# Altium footprint library WE-SHC.PcbLib: 139 footprints (part 4 of 10)
Each footprint in its own frame and in the unit in brackets; x right, y up, seen from the top. Pads: shape width x height; smd on the part's side, far side on the other; paste and mask are expansions set on the pad; w line width, h text height; cw(c..) or ccw(c..) is an arc to the next point about the centre after c.
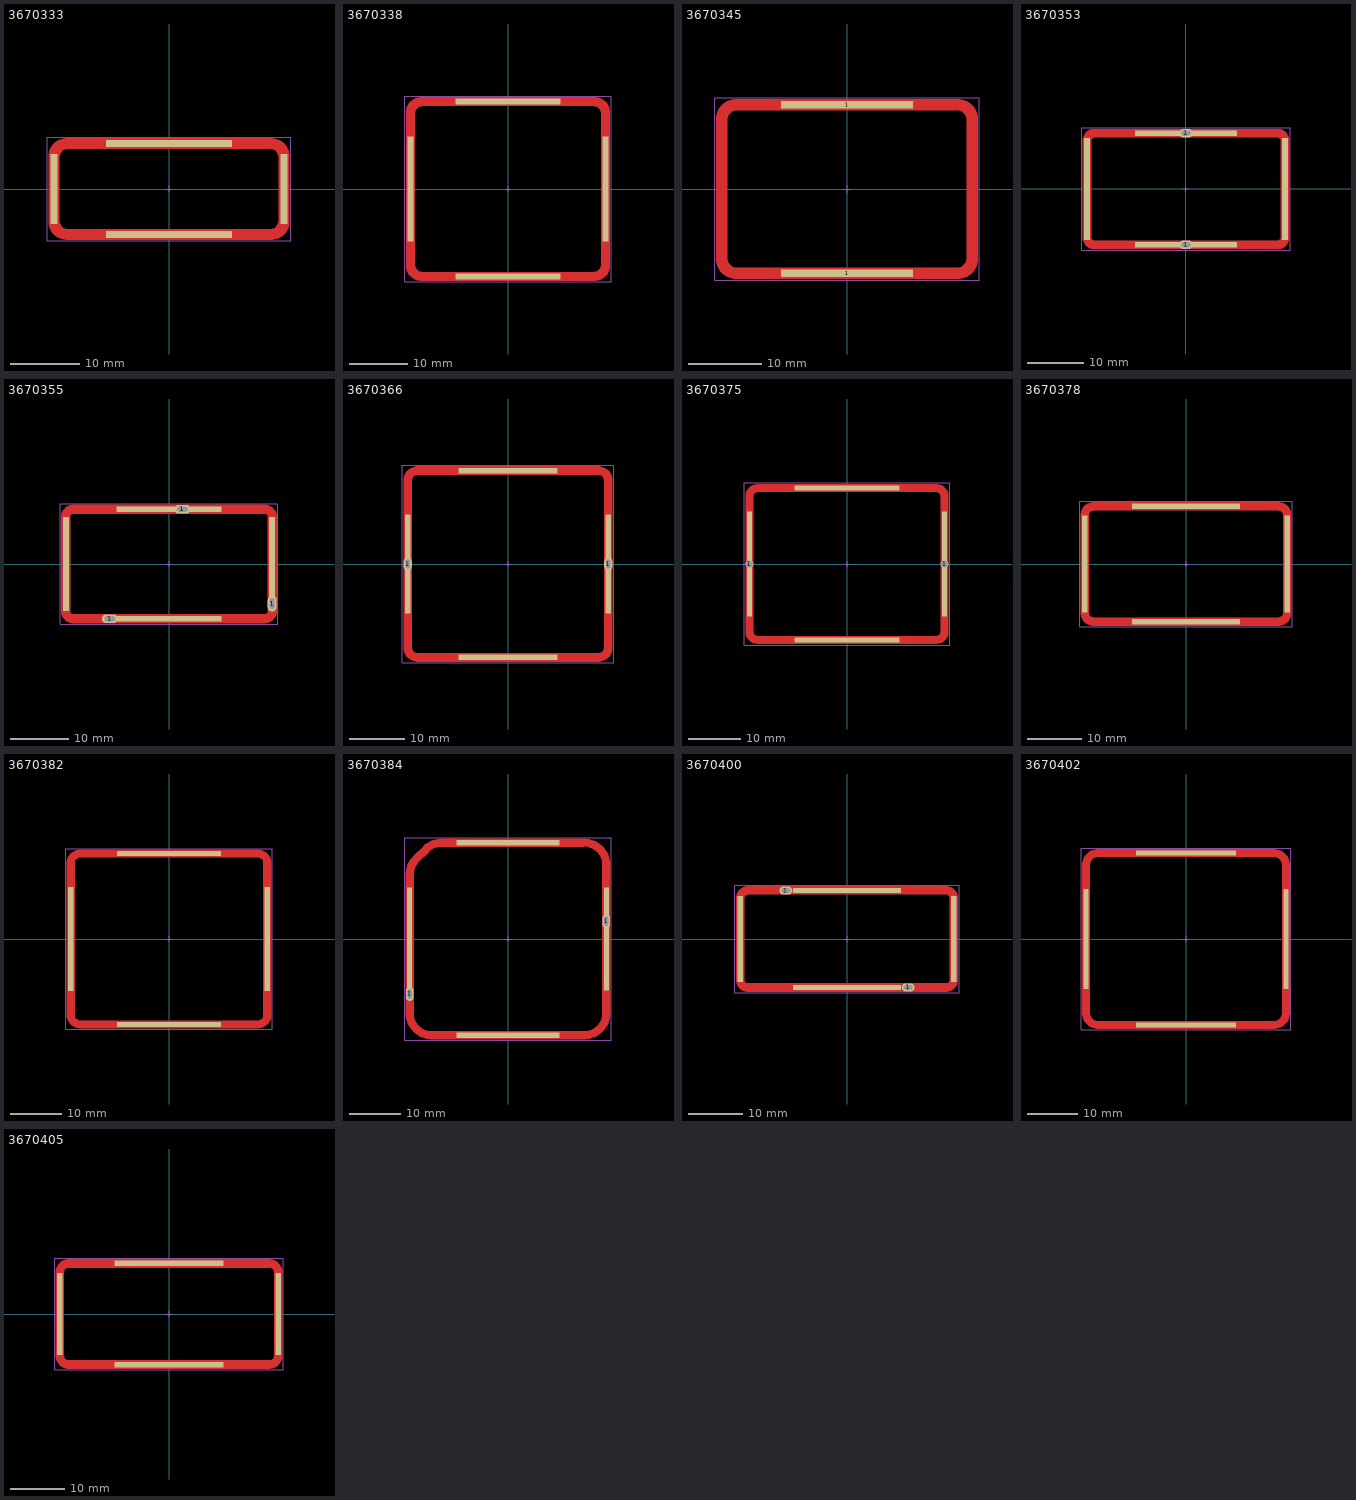
[diagram p3: the footprints below, top view; thin cyan lines are the x and y axes]

## 3670333 [mm] "Shielding Cabinet, SMT Frame Seamless, 33.3x13.3x4.4mm"
height 4.4
pads (4):
  rect 1x10 smd paste-2539.97 mask-2222: 1(-16.5,0) 1(16.5,0)
  rect 18x1 smd paste-2539.97 mask-2222: 1(0,-6.5) 1(0,6.5)
Top Layer:
  region: -17.25,-0.25 -17.25,-4.65 -17.25,-4.906 -17.15,-5.408 -16.954,-5.882 -16.67,-6.307 -16.307,-6.67 -15.882,-6.954 -15.408,-7.15 -14.906,-7.25 -14.65,-7.25 14.65,-7.25 14.906,-7.25 15.408,-7.15 15.882,-6.954 16.307,-6.67 16.67,-6.307 16.954,-5.882 17.15,-5.408 17.25,-4.906 17.25,-4.65 17.25,-0.25 15.75,-0.25 15.75,-4.45 15.744,-4.577 15.694,-4.827 15.596,-5.063 15.455,-5.275 15.275,-5.455 15.063,-5.596 14.827,-5.694 14.577,-5.744 14.45,-5.75 -14.45,-5.75 -14.577,-5.744 -14.827,-5.694 -15.063,-5.596 -15.275,-5.455 -15.455,-5.275 -15.596,-5.063 -15.694,-4.827 -15.744,-4.577 -15.75,-4.45 -15.75,-0.25
  region: -17.25,-1 -17.25,4.65 -17.25,4.906 -17.15,5.408 -16.954,5.882 -16.67,6.307 -16.307,6.67 -15.882,6.954 -15.408,7.15 -14.906,7.25 -14.65,7.25 14.65,7.25 14.906,7.25 15.408,7.15 15.882,6.954 16.307,6.67 16.67,6.307 16.954,5.882 17.15,5.408 17.25,4.906 17.25,4.65 17.25,-1 15.75,-1 15.75,4.45 15.744,4.577 15.694,4.827 15.596,5.063 15.455,5.275 15.275,5.455 15.063,5.596 14.827,5.694 14.577,5.744 14.45,5.75 -14.45,5.75 -14.577,5.744 -14.827,5.694 -15.063,5.596 -15.275,5.455 -15.455,5.275 -15.596,5.063 -15.694,4.827 -15.744,4.577 -15.75,4.45 -15.75,-1
Top Paste:
  region: -17.25,0.25 -17.25,4.65 -17.25,4.906 -17.15,5.408 -16.954,5.882 -16.67,6.307 -16.307,6.67 -15.882,6.954 -15.408,7.15 -14.906,7.25 -14.65,7.25 14.65,7.25 14.906,7.25 15.408,7.15 15.882,6.954 16.307,6.67 16.67,6.307 16.954,5.882 17.15,5.408 17.25,4.906 17.25,4.65 17.25,0.25 15.75,0.25 15.75,4.45 15.744,4.577 15.694,4.827 15.596,5.063 15.455,5.275 15.275,5.455 15.063,5.596 14.827,5.694 14.577,5.744 14.45,5.75 -14.45,5.75 -14.577,5.744 -14.827,5.694 -15.063,5.596 -15.275,5.455 -15.455,5.275 -15.596,5.063 -15.694,4.827 -15.744,4.577 -15.75,4.45 -15.75,0.25
  region: -17.25,-0.25 -17.25,-4.65 -17.25,-4.906 -17.15,-5.408 -16.954,-5.882 -16.67,-6.307 -16.307,-6.67 -15.882,-6.954 -15.408,-7.15 -14.906,-7.25 -14.65,-7.25 14.65,-7.25 14.906,-7.25 15.408,-7.15 15.882,-6.954 16.307,-6.67 16.67,-6.307 16.954,-5.882 17.15,-5.408 17.25,-4.906 17.25,-4.65 17.25,-0.25 15.75,-0.25 15.75,-4.45 15.744,-4.577 15.694,-4.827 15.596,-5.063 15.455,-5.275 15.275,-5.455 15.063,-5.596 14.827,-5.694 14.577,-5.744 14.45,-5.75 -14.45,-5.75 -14.577,-5.744 -14.827,-5.694 -15.063,-5.596 -15.275,-5.455 -15.455,-5.275 -15.596,-5.063 -15.694,-4.827 -15.744,-4.577 -15.75,-4.45 -15.75,-0.25
Notes:
  text "recommended tin paste thickness=0.5mm / customer to define the final stencil gap" at -6.1,-8.9 h0.4
Top Designator:
  text ".Designator" at -7.498,-0.5 h1.5
Top Component Outline:
  lines w0.1: -16.65,-4.65 ccw(c-14.65,-4.65) -14.65,-6.65 14.65,-6.65 ccw(c14.65,-4.65) 16.65,-4.65 16.65,4.65 ccw(c14.65,4.65) 14.65,6.65 -14.65,6.65 ccw(c-14.65,4.65) -16.65,4.65 -16.65,-4.65
Top 3D Body:
  lines w0.1: -16.65,-4.65 ccw(c-14.65,-4.65) -14.65,-6.65 14.65,-6.65 ccw(c14.65,-4.65) 16.65,-4.65 16.65,4.65 ccw(c14.65,4.65) 14.65,6.65 -14.65,6.65 ccw(c-14.65,4.65) -16.65,4.65 -16.65,-4.65
Top Courtyard:
  lines w0.05: -0.5,0 0.5,0 ; 0,-0.5 0,0.5 ; -17.45,-7.45 -17.45,7.45 17.45,7.45 17.45,-7.45 -17.45,-7.45
3D body "3670333.stp": height 4.4, standoff 0, extent -16.65,-6.65 16.65,6.65

## 3670338 [mm] "Shielding Cabinet, SMT Frame Seamless, 33.8x30.3x3.3mm"
height 3.3
pads (4):
  rect 1x18 smd paste-2539.97 mask-2222: 1(-16.75,0) 1(16.75,0)
  rect 18x1 smd paste-2539.97 mask-2222: 1(0,-15) 1(0,15)
Top Layer:
  region: -17.5,-1 -17.5,13.15 -17.5,13.406 -17.4,13.908 -17.204,14.382 -16.92,14.807 -16.557,15.17 -16.132,15.454 -15.658,15.65 -15.156,15.75 -14.9,15.75 14.9,15.75 15.156,15.75 15.658,15.65 16.132,15.454 16.557,15.17 16.92,14.807 17.204,14.382 17.4,13.908 17.5,13.406 17.5,13.15 17.5,-1 16,-1 16,12.95 15.994,13.077 15.944,13.327 15.846,13.563 15.705,13.775 15.525,13.955 15.313,14.096 15.077,14.194 14.827,14.244 14.7,14.25 -14.7,14.25 -14.827,14.244 -15.077,14.194 -15.313,14.096 -15.525,13.955 -15.705,13.775 -15.846,13.563 -15.944,13.327 -15.994,13.077 -16,12.95 -16,-1
  region: -17.5,-0.25 -17.5,-13.15 -17.5,-13.406 -17.4,-13.908 -17.204,-14.382 -16.92,-14.807 -16.557,-15.17 -16.132,-15.454 -15.658,-15.65 -15.156,-15.75 -14.9,-15.75 14.9,-15.75 15.156,-15.75 15.658,-15.65 16.132,-15.454 16.557,-15.17 16.92,-14.807 17.204,-14.382 17.4,-13.908 17.5,-13.406 17.5,-13.15 17.5,-0.25 16,-0.25 16,-12.95 15.994,-13.077 15.944,-13.327 15.846,-13.563 15.705,-13.775 15.525,-13.955 15.313,-14.096 15.077,-14.194 14.827,-14.244 14.7,-14.25 -14.7,-14.25 -14.827,-14.244 -15.077,-14.194 -15.313,-14.096 -15.525,-13.955 -15.705,-13.775 -15.846,-13.563 -15.944,-13.327 -15.994,-13.077 -16,-12.95 -16,-0.25
Top Paste:
  region: -17.5,-0.25 -17.5,-13.15 -17.5,-13.406 -17.4,-13.908 -17.204,-14.382 -16.92,-14.807 -16.557,-15.17 -16.132,-15.454 -15.658,-15.65 -15.156,-15.75 -14.9,-15.75 14.9,-15.75 15.156,-15.75 15.658,-15.65 16.132,-15.454 16.557,-15.17 16.92,-14.807 17.204,-14.382 17.4,-13.908 17.5,-13.406 17.5,-13.15 17.5,-0.25 16,-0.25 16,-12.95 15.994,-13.077 15.944,-13.327 15.846,-13.563 15.705,-13.775 15.525,-13.955 15.313,-14.096 15.077,-14.194 14.827,-14.244 14.7,-14.25 -14.7,-14.25 -14.827,-14.244 -15.077,-14.194 -15.313,-14.096 -15.525,-13.955 -15.705,-13.775 -15.846,-13.563 -15.944,-13.327 -15.994,-13.077 -16,-12.95 -16,-0.25
  region: -17.5,0.25 -17.5,13.15 -17.5,13.406 -17.4,13.908 -17.204,14.382 -16.92,14.807 -16.557,15.17 -16.132,15.454 -15.658,15.65 -15.156,15.75 -14.9,15.75 14.9,15.75 15.156,15.75 15.658,15.65 16.132,15.454 16.557,15.17 16.92,14.807 17.204,14.382 17.4,13.908 17.5,13.406 17.5,13.15 17.5,0.25 16,0.25 16,12.95 15.994,13.077 15.944,13.327 15.846,13.563 15.705,13.775 15.525,13.955 15.313,14.096 15.077,14.194 14.827,14.244 14.7,14.25 -14.7,14.25 -14.827,14.244 -15.077,14.194 -15.313,14.096 -15.525,13.955 -15.705,13.775 -15.846,13.563 -15.944,13.327 -15.994,13.077 -16,12.95 -16,0.25
Notes:
  text "recommended tin paste thickness=0.5mm / customer to define the final stencil gap" at -5.55,-17.45 h0.4
Top Designator:
  text ".Designator" at -7.498,-0.5 h1.5
Top Component Outline:
  lines w0.1: -16.9,-13.15 ccw(c-14.9,-13.15) -14.9,-15.15 14.9,-15.15 ccw(c14.9,-13.15) 16.9,-13.15 16.9,13.15 ccw(c14.9,13.15) 14.9,15.15 -14.9,15.15 ccw(c-14.9,13.15) -16.9,13.15 -16.9,-13.15
Top 3D Body:
  lines w0.1: -16.9,-13.15 ccw(c-14.9,-13.15) -14.9,-15.15 14.9,-15.15 ccw(c14.9,-13.15) 16.9,-13.15 16.9,13.15 ccw(c14.9,13.15) 14.9,15.15 -14.9,15.15 ccw(c-14.9,13.15) -16.9,13.15 -16.9,-13.15
Top Courtyard:
  lines w0.05: -0.5,0 0.5,0 ; 0,-0.5 0,0.5 ; -17.7,-15.95 -17.7,15.95 17.7,15.95 17.7,-15.95 -17.7,-15.95
3D body "3670338.stp": height 3.3, standoff 0, extent -16.9,-15.15 16.9,15.15

## 3670345 [mm] "Shielding Cabinet, SMT Frame Seamless, 34.5x23.3x3.5mm"
height 3.5
pads (2):
  rect 18x1 smd paste-2539.97 mask-2222: 1(0,-11.5) 1(0,11.5)
Top Layer:
  region: -17.85,-1 -17.85,9.65 -17.85,9.906 -17.75,10.408 -17.554,10.882 -17.27,11.307 -16.907,11.67 -16.482,11.954 -16.008,12.15 -15.506,12.25 -15.25,12.25 15.25,12.25 15.506,12.25 16.008,12.15 16.482,11.954 16.907,11.67 17.27,11.307 17.554,10.882 17.75,10.408 17.85,9.906 17.85,9.65 17.85,-1 16.35,-1 16.35,9.45 16.344,9.577 16.294,9.827 16.196,10.063 16.055,10.275 15.875,10.455 15.663,10.596 15.427,10.694 15.177,10.744 15.05,10.75 -15.05,10.75 -15.177,10.744 -15.427,10.694 -15.663,10.596 -15.875,10.455 -16.055,10.275 -16.196,10.063 -16.294,9.827 -16.344,9.577 -16.35,9.45 -16.35,-1
  region: -17.85,-0.25 -17.85,-9.65 -17.85,-9.906 -17.75,-10.408 -17.554,-10.882 -17.27,-11.307 -16.907,-11.67 -16.482,-11.954 -16.008,-12.15 -15.506,-12.25 -15.25,-12.25 15.25,-12.25 15.506,-12.25 16.008,-12.15 16.482,-11.954 16.907,-11.67 17.27,-11.307 17.554,-10.882 17.75,-10.408 17.85,-9.906 17.85,-9.65 17.85,-0.25 16.35,-0.25 16.35,-9.45 16.344,-9.577 16.294,-9.827 16.196,-10.063 16.055,-10.275 15.875,-10.455 15.663,-10.596 15.427,-10.694 15.177,-10.744 15.05,-10.75 -15.05,-10.75 -15.177,-10.744 -15.427,-10.694 -15.663,-10.596 -15.875,-10.455 -16.055,-10.275 -16.196,-10.063 -16.294,-9.827 -16.344,-9.577 -16.35,-9.45 -16.35,-0.25
Top Paste:
  region: -17.85,-0.25 -17.85,-9.65 -17.85,-9.906 -17.75,-10.408 -17.554,-10.882 -17.27,-11.307 -16.907,-11.67 -16.482,-11.954 -16.008,-12.15 -15.506,-12.25 -15.25,-12.25 15.25,-12.25 15.506,-12.25 16.008,-12.15 16.482,-11.954 16.907,-11.67 17.27,-11.307 17.554,-10.882 17.75,-10.408 17.85,-9.906 17.85,-9.65 17.85,-0.25 16.35,-0.25 16.35,-9.45 16.344,-9.577 16.294,-9.827 16.196,-10.063 16.055,-10.275 15.875,-10.455 15.663,-10.596 15.427,-10.694 15.177,-10.744 15.05,-10.75 -15.05,-10.75 -15.177,-10.744 -15.427,-10.694 -15.663,-10.596 -15.875,-10.455 -16.055,-10.275 -16.196,-10.063 -16.294,-9.827 -16.344,-9.577 -16.35,-9.45 -16.35,-0.25
  region: -17.85,0.25 -17.85,9.65 -17.85,9.906 -17.75,10.408 -17.554,10.882 -17.27,11.307 -16.907,11.67 -16.482,11.954 -16.008,12.15 -15.506,12.25 -15.25,12.25 15.25,12.25 15.506,12.25 16.008,12.15 16.482,11.954 16.907,11.67 17.27,11.307 17.554,10.882 17.75,10.408 17.85,9.906 17.85,9.65 17.85,0.25 16.35,0.25 16.35,9.45 16.344,9.577 16.294,9.827 16.196,10.063 16.055,10.275 15.875,10.455 15.663,10.596 15.427,10.694 15.177,10.744 15.05,10.75 -15.05,10.75 -15.177,10.744 -15.427,10.694 -15.663,10.596 -15.875,10.455 -16.055,10.275 -16.196,10.063 -16.294,9.827 -16.344,9.577 -16.35,9.45 -16.35,0.25
Notes:
  text "recommended tin paste thickness=0.5mm / customer to define the final stencil gap" at -5.5,-13.85 h0.4
Top Designator:
  text ".Designator" at -7.498,-0.5 h1.5
Top Component Outline:
  lines w0.1: -17.25,-9.65 ccw(c-15.25,-9.65) -15.25,-11.65 15.25,-11.65 ccw(c15.25,-9.65) 17.25,-9.65 17.25,9.65 ccw(c15.25,9.65) 15.25,11.65 -15.25,11.65 ccw(c-15.25,9.65) -17.25,9.65 -17.25,-9.65
Top 3D Body:
  lines w0.1: -17.25,-9.65 ccw(c-15.25,-9.65) -15.25,-11.65 15.25,-11.65 ccw(c15.25,-9.65) 17.25,-9.65 17.25,9.65 ccw(c15.25,9.65) 15.25,11.65 -15.25,11.65 ccw(c-15.25,9.65) -17.25,9.65 -17.25,-9.65
Top Courtyard:
  lines w0.05: -0.5,0 0.5,0 ; 0,-0.5 0,0.5 ; -18.05,-12.45 -18.05,12.45 18.05,12.45 18.05,-12.45 -18.05,-12.45
3D body "3670345.stp": height 3.5, standoff 0, extent -17.25,-11.65 17.25,11.65

## 3670353 [mm] "Shielding Cabinet, SMT Frame Seamless, 35.3x20x6.4mm"
height 6.4
pads (6):
  rect 1x18 smd paste-2539.97 mask-2222: 1(-17.5,0) 1(17.5,0)
  rect 18x1 smd paste-2539.97 mask-2222: 1(0,-9.85) 1(0,9.85)
  oval 2.4x1.5 hole 0.8 slot 1.6 at 0 deg: 1(0,-9.85) 1(0,9.85)
Top Layer:
  region: -18.25,-1 -18.25,8.55 -18.25,8.752 -18.171,9.148 -18.017,9.521 -17.792,9.857 -17.507,10.142 -17.171,10.367 -16.798,10.521 -16.402,10.6 -16.2,10.6 16.2,10.6 16.402,10.6 16.798,10.521 17.171,10.367 17.507,10.142 17.792,9.857 18.017,9.521 18.171,9.148 18.25,8.752 18.25,8.55 18.25,-1 16.75,-1 16.75,8.55 16.739,8.657 16.657,8.856 16.506,9.007 16.307,9.089 16.2,9.1 -16.2,9.1 -16.307,9.089 -16.506,9.007 -16.657,8.856 -16.739,8.657 -16.75,8.55 -16.75,-1
  region: -18.25,-0.25 -18.25,-8.55 -18.25,-8.752 -18.171,-9.148 -18.017,-9.521 -17.792,-9.857 -17.507,-10.142 -17.171,-10.367 -16.798,-10.521 -16.402,-10.6 -16.2,-10.6 16.2,-10.6 16.402,-10.6 16.798,-10.521 17.171,-10.367 17.507,-10.142 17.792,-9.857 18.017,-9.521 18.171,-9.148 18.25,-8.752 18.25,-8.55 18.25,-0.25 16.75,-0.25 16.75,-8.55 16.739,-8.657 16.657,-8.856 16.506,-9.007 16.307,-9.089 16.2,-9.1 -16.2,-9.1 -16.307,-9.089 -16.506,-9.007 -16.657,-8.856 -16.739,-8.657 -16.75,-8.55 -16.75,-0.25
Top Paste:
  region: -18.25,-0.25 -18.25,-8.55 -18.25,-8.752 -18.171,-9.148 -18.017,-9.521 -17.792,-9.857 -17.507,-10.142 -17.171,-10.367 -16.798,-10.521 -16.402,-10.6 -16.2,-10.6 16.2,-10.6 16.402,-10.6 16.798,-10.521 17.171,-10.367 17.507,-10.142 17.792,-9.857 18.017,-9.521 18.171,-9.148 18.25,-8.752 18.25,-8.55 18.25,-0.25 16.75,-0.25 16.75,-8.55 16.739,-8.657 16.657,-8.856 16.506,-9.007 16.307,-9.089 16.2,-9.1 -16.2,-9.1 -16.307,-9.089 -16.506,-9.007 -16.657,-8.856 -16.739,-8.657 -16.75,-8.55 -16.75,-0.25
  region: -18.25,0.25 -18.25,8.55 -18.25,8.752 -18.171,9.148 -18.017,9.521 -17.792,9.857 -17.507,10.142 -17.171,10.367 -16.798,10.521 -16.402,10.6 -16.2,10.6 16.2,10.6 16.402,10.6 16.798,10.521 17.171,10.367 17.507,10.142 17.792,9.857 18.017,9.521 18.171,9.148 18.25,8.752 18.25,8.55 18.25,0.25 16.75,0.25 16.75,8.55 16.739,8.657 16.657,8.856 16.506,9.007 16.307,9.089 16.2,9.1 -16.2,9.1 -16.307,9.089 -16.506,9.007 -16.657,8.856 -16.739,8.657 -16.75,8.55 -16.75,0.25
Notes:
  text "recommended tin paste thickness=0.5mm / customer to define the final stencil gap" at -5.4,-12.25 h0.4
Top Designator:
  text ".Designator" at -7.498,-0.5 h1.5
Top Component Outline:
  lines w0.1: -17.65,-8.5 ccw(c-16.15,-8.5) -16.15,-10 16.15,-10 ccw(c16.15,-8.5) 17.65,-8.5 17.65,8.5 ccw(c16.15,8.5) 16.15,10 -16.15,10 ccw(c-16.15,8.5) -17.65,8.5 -17.65,-8.5
Top 3D Body:
  lines w0.1: -17.65,-8.5 ccw(c-16.15,-8.5) -16.15,-10 16.15,-10 ccw(c16.15,-8.5) 17.65,-8.5 17.65,8.5 ccw(c16.15,8.5) 16.15,10 -16.15,10 ccw(c-16.15,8.5) -17.65,8.5 -17.65,-8.5
Top Courtyard:
  lines w0.05: -0.5,0 0.5,0 ; 0,-0.5 0,0.5 ; -18.45,-10.8 -18.45,10.8 18.45,10.8 18.45,-10.8 -18.45,-10.8
3D body "3670353.stp": height 6.4, standoff -0.6, extent -17.65,-10 17.65,10

## 3670355 [mm] "Shielding Cabinet, SMT Frame Seamless, 35.5x19x5.5mm"
height 5.5
pads (7):
  rect 1x16 smd paste-2539.97 mask-2222: 1(-17.6,0) 1(17.6,0)
  oval 2.7x1.5 hole 0.8 slot 1.8 at 0 deg: 1(-10.1,-9.35) 1(2.3,9.35)
  rect 18x1 smd paste-2539.97 mask-2222: 1(0,-9.35) 1(0,9.35)
  oval 1.5x2.7 hole 0.8 slot 1.8 at 90 deg: 1(17.6,-6.75)
Top Layer:
  region: -18.35,-0.25 -18.35,-8.1 -18.35,-8.297 -18.273,-8.683 -18.122,-9.047 -17.903,-9.375 -17.625,-9.654 -17.297,-9.872 -16.933,-10.023 -16.547,-10.1 -16.35,-10.1 16.35,-10.1 16.547,-10.1 16.933,-10.023 17.297,-9.872 17.625,-9.654 17.903,-9.375 18.122,-9.047 18.273,-8.683 18.35,-8.297 18.35,-8.1 18.35,-0.25 16.85,-0.25 16.85,-8.1 16.84,-8.198 16.766,-8.378 16.628,-8.516 16.448,-8.59 16.35,-8.6 -16.35,-8.6 -16.448,-8.59 -16.628,-8.516 -16.766,-8.378 -16.84,-8.198 -16.85,-8.1 -16.85,-0.25
  region: -18.35,-1 -18.35,8.1 -18.35,8.297 -18.273,8.683 -18.122,9.047 -17.903,9.375 -17.625,9.654 -17.297,9.872 -16.933,10.023 -16.547,10.1 -16.35,10.1 16.35,10.1 16.547,10.1 16.933,10.023 17.297,9.872 17.625,9.654 17.903,9.375 18.122,9.047 18.273,8.683 18.35,8.297 18.35,8.1 18.35,-1 16.85,-1 16.85,8.1 16.84,8.198 16.766,8.378 16.628,8.516 16.448,8.59 16.35,8.6 -16.35,8.6 -16.448,8.59 -16.628,8.516 -16.766,8.378 -16.84,8.198 -16.85,8.1 -16.85,-1
Top Paste:
  region: -18.35,0.25 -18.35,8.1 -18.35,8.297 -18.273,8.683 -18.122,9.047 -17.903,9.375 -17.625,9.654 -17.297,9.872 -16.933,10.023 -16.547,10.1 -16.35,10.1 16.35,10.1 16.547,10.1 16.933,10.023 17.297,9.872 17.625,9.654 17.903,9.375 18.122,9.047 18.273,8.683 18.35,8.297 18.35,8.1 18.35,0.25 16.85,0.25 16.85,8.1 16.84,8.198 16.766,8.378 16.628,8.516 16.448,8.59 16.35,8.6 -16.35,8.6 -16.448,8.59 -16.628,8.516 -16.766,8.378 -16.84,8.198 -16.85,8.1 -16.85,0.25
  region: -18.35,-0.25 -18.35,-8.1 -18.35,-8.297 -18.273,-8.683 -18.122,-9.047 -17.903,-9.375 -17.625,-9.654 -17.297,-9.872 -16.933,-10.023 -16.547,-10.1 -16.35,-10.1 16.35,-10.1 16.547,-10.1 16.933,-10.023 17.297,-9.872 17.625,-9.654 17.903,-9.375 18.122,-9.047 18.273,-8.683 18.35,-8.297 18.35,-8.1 18.35,-0.25 16.85,-0.25 16.85,-8.1 16.84,-8.198 16.766,-8.378 16.628,-8.516 16.448,-8.59 16.35,-8.6 -16.35,-8.6 -16.448,-8.59 -16.628,-8.516 -16.766,-8.378 -16.84,-8.198 -16.85,-8.1 -16.85,-0.25
Notes:
  text "recommended tin paste thickness=0.5mm / customer to define the final stencil gap" at -5.6,-11.65 h0.4
Top Designator:
  text ".Designator" at -7.498,-0.5 h1.5
Top Component Outline:
  lines w0.1: -17.75,-8.15 ccw(c-16.4,-8.15) -16.4,-9.5 16.4,-9.5 ccw(c16.4,-8.15) 17.75,-8.15 17.75,8.15 ccw(c16.4,8.15) 16.4,9.5 -16.4,9.5 ccw(c-16.4,8.15) -17.75,8.15 -17.75,-8.15
Top 3D Body:
  lines w0.1: -17.75,-8.15 ccw(c-16.4,-8.15) -16.4,-9.5 16.4,-9.5 ccw(c16.4,-8.15) 17.75,-8.15 17.75,8.15 ccw(c16.4,8.15) 16.4,9.5 -16.4,9.5 ccw(c-16.4,8.15) -17.75,8.15 -17.75,-8.15
Top Courtyard:
  lines w0.05: -0.5,0 0.5,0 ; 0,-0.5 0,0.5 ; -18.55,-10.3 -18.55,10.3 18.55,10.3 18.55,-10.3 -18.55,-10.3
3D body "3670355.stp": height 5.5, standoff -1, extent -17.75,-9.5 17.75,9.5

## 3670366 [mm] "Shielding Cabinet, SMT Frame Seamless, 36.6x34.1x3.3mm"
height 3.3
pads (6):
  rect 1x18 smd paste-2539.97 mask-2222: 1(-18.15,0) 1(18.15,0)
  oval 1.5x2.4 hole 0.8 slot 1.6 at 90 deg: 1(-18.15,0) 1(18.15,0)
  rect 18x1 smd paste-2539.97 mask-2222: 1(0,-16.9) 1(0,16.9)
Top Layer:
  region: -18.9,-15.15 -18.9,15.15 -18.9,15.396 -18.804,15.879 -18.615,16.334 -18.342,16.744 -17.994,17.092 -17.584,17.365 -17.129,17.554 -16.646,17.65 -16.4,17.65 1,17.65 1,16.15 -16.4,16.15 -16.498,16.145 -16.69,16.107 -16.871,16.032 -17.034,15.923 -17.173,15.784 -17.282,15.621 -17.357,15.44 -17.395,15.248 -17.4,15.15 -17.4,-15.15 -17.395,-15.248 -17.357,-15.44 -17.282,-15.621 -17.173,-15.784 -17.034,-15.923 -16.871,-16.032 -16.69,-16.107 -16.498,-16.145 -16.4,-16.15 1,-16.15 1,-17.65 -16.4,-17.65 -16.646,-17.65 -17.129,-17.554 -17.584,-17.365 -17.994,-17.092 -18.342,-16.744 -18.615,-16.334 -18.804,-15.879 -18.9,-15.396
  region: 18.9,-15.15 18.9,15.15 18.9,15.396 18.804,15.879 18.615,16.334 18.342,16.744 17.994,17.092 17.584,17.365 17.129,17.554 16.646,17.65 16.4,17.65 0.25,17.65 0.25,16.15 16.4,16.15 16.498,16.145 16.69,16.107 16.871,16.032 17.034,15.923 17.173,15.784 17.282,15.621 17.357,15.44 17.395,15.248 17.4,15.15 17.4,-15.15 17.395,-15.248 17.357,-15.44 17.282,-15.621 17.173,-15.784 17.034,-15.923 16.871,-16.032 16.69,-16.107 16.498,-16.145 16.4,-16.15 0.25,-16.15 0.25,-17.65 16.4,-17.65 16.646,-17.65 17.129,-17.554 17.584,-17.365 17.994,-17.092 18.342,-16.744 18.615,-16.334 18.804,-15.879 18.9,-15.396
Top Paste:
  region: 18.9,-15.15 18.9,15.15 18.9,15.396 18.804,15.879 18.615,16.334 18.342,16.744 17.994,17.092 17.584,17.365 17.129,17.554 16.646,17.65 16.4,17.65 0.25,17.65 0.25,16.15 16.4,16.15 16.498,16.145 16.69,16.107 16.871,16.032 17.034,15.923 17.173,15.784 17.282,15.621 17.357,15.44 17.395,15.248 17.4,15.15 17.4,-15.15 17.395,-15.248 17.357,-15.44 17.282,-15.621 17.173,-15.784 17.034,-15.923 16.871,-16.032 16.69,-16.107 16.498,-16.145 16.4,-16.15 0.25,-16.15 0.25,-17.65 16.4,-17.65 16.646,-17.65 17.129,-17.554 17.584,-17.365 17.994,-17.092 18.342,-16.744 18.615,-16.334 18.804,-15.879 18.9,-15.396
  region: -18.9,-15.15 -18.9,15.15 -18.9,15.396 -18.804,15.879 -18.615,16.334 -18.342,16.744 -17.994,17.092 -17.584,17.365 -17.129,17.554 -16.646,17.65 -16.4,17.65 -0.25,17.65 -0.25,16.15 -16.4,16.15 -16.498,16.145 -16.69,16.107 -16.871,16.032 -17.034,15.923 -17.173,15.784 -17.282,15.621 -17.357,15.44 -17.395,15.248 -17.4,15.15 -17.4,-15.15 -17.395,-15.248 -17.357,-15.44 -17.282,-15.621 -17.173,-15.784 -17.034,-15.923 -16.871,-16.032 -16.69,-16.107 -16.498,-16.145 -16.4,-16.15 -0.25,-16.15 -0.25,-17.65 -16.4,-17.65 -16.646,-17.65 -17.129,-17.554 -17.584,-17.365 -17.994,-17.092 -18.342,-16.744 -18.615,-16.334 -18.804,-15.879 -18.9,-15.396
Notes:
  text "recommended tin paste thickness=0.5mm / customer to define the final stencil gap" at -6.1,-19.3 h0.4
Top Designator:
  text ".Designator" at -7.498,-0.5 h1.5
Top Component Outline:
  lines w0.1: -18.3,-15.05 ccw(c-16.3,-15.05) -16.3,-17.05 16.3,-17.05 ccw(c16.3,-15.05) 18.3,-15.05 18.3,15.05 ccw(c16.3,15.05) 16.3,17.05 -16.3,17.05 ccw(c-16.3,15.05) -18.3,15.05 -18.3,-15.05
Top 3D Body:
  lines w0.1: -18.3,-15.05 ccw(c-16.3,-15.05) -16.3,-17.05 16.3,-17.05 ccw(c16.3,-15.05) 18.3,-15.05 18.3,15.05 ccw(c16.3,15.05) 16.3,17.05 -16.3,17.05 ccw(c-16.3,15.05) -18.3,15.05 -18.3,-15.05
Top Courtyard:
  lines w0.05: -0.5,0 0.5,0 ; 0,-0.5 0,0.5 ; -19.1,-17.85 19.1,-17.85 19.1,17.85 -19.1,17.85 -19.1,-17.85
3D body "3670366.stp": height 3.3, standoff -0.8, extent -18.3,-17.05 18.3,17.05
